# Altium footprint library Conectores GAM.PcbLib: 182 footprints (part 5 of 12)
Each footprint in its own frame and in the unit in brackets; x right, y up, seen from the top. Pads: shape width x height; smd on the part's side, far side on the other; paste and mask are expansions set on the pad; w line width, h text height; cw(c..) or ccw(c..) is an arc to the next point about the centre after c.
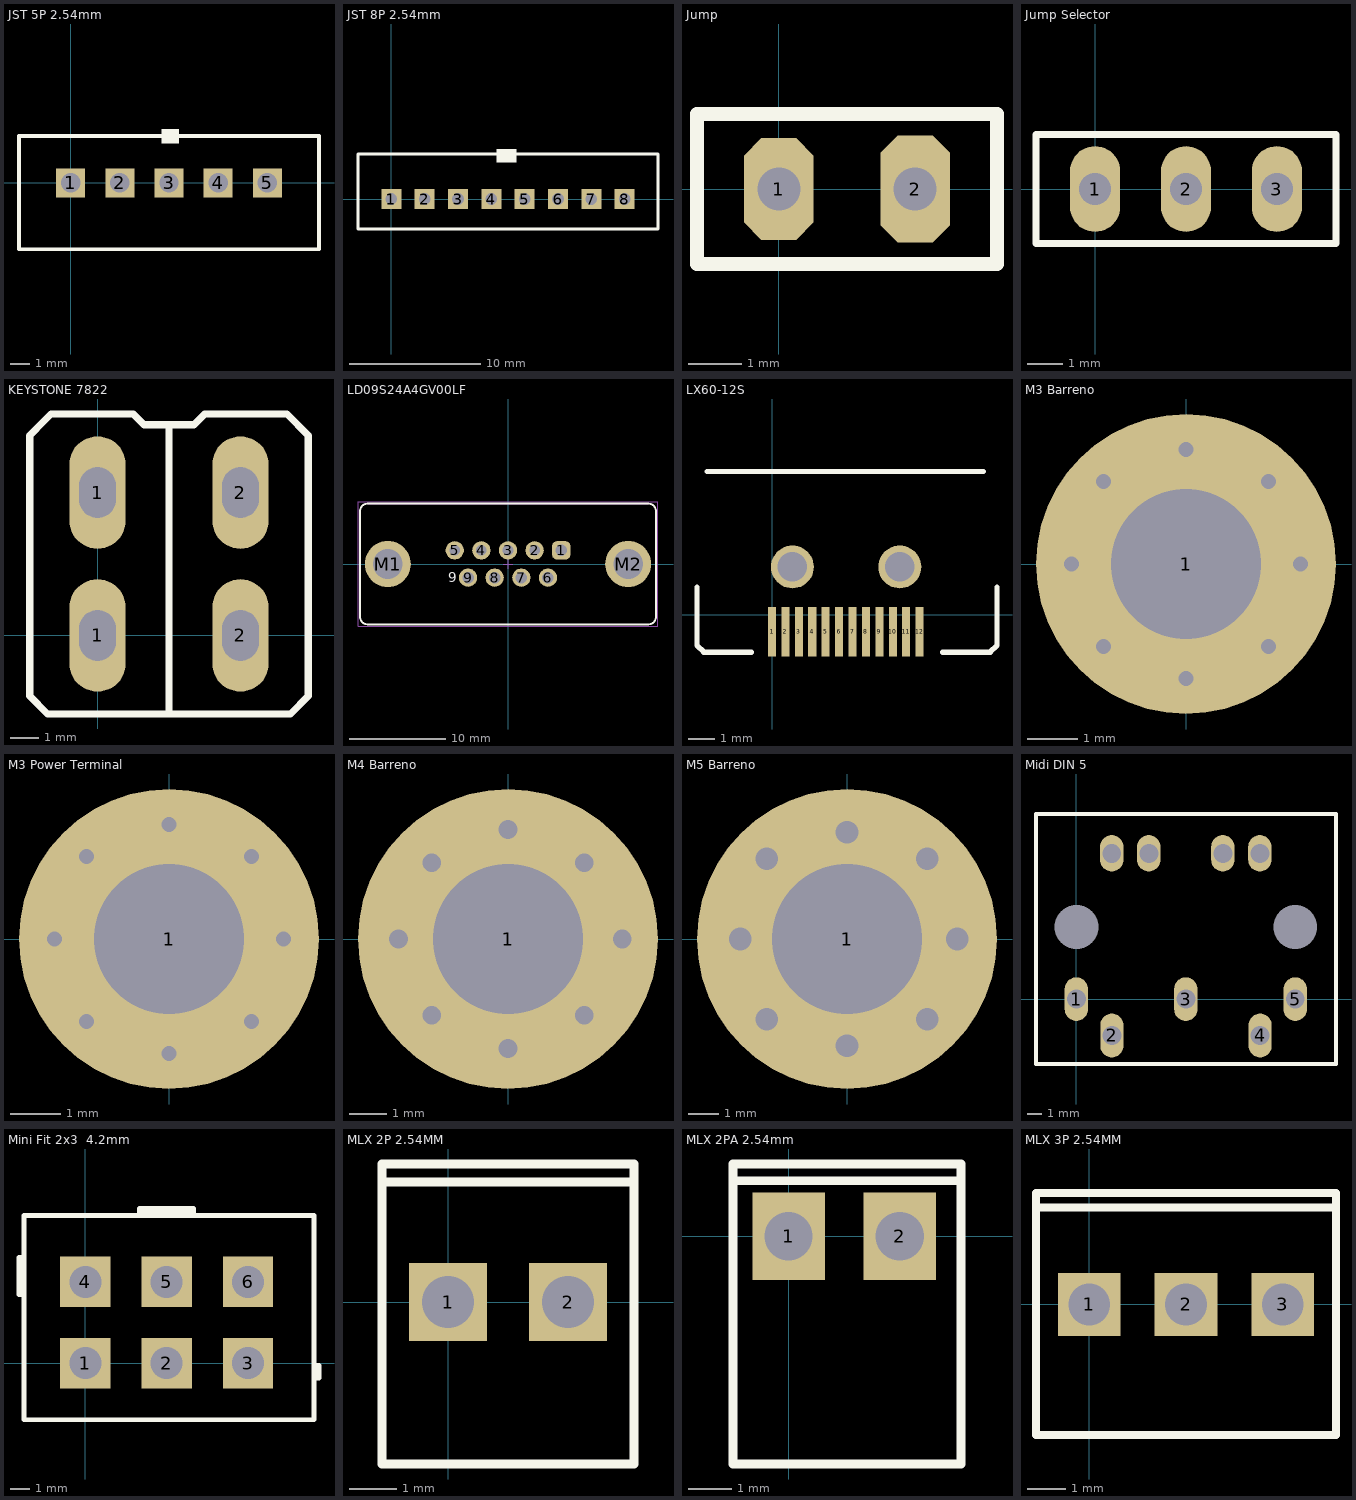
[diagram p4: the footprints below, top view; thin cyan lines are the x and y axes]

## JST 5P 2.54mm [mm]
pads (5):
  rect 1.5x1.5 hole 1: 1(0,0) 2(2.54,0) 3(5.08,0) 4(7.62,0) 5(10.16,0)
Top Overlay:
  rectangle: 4.699,2.032 5.588,2.794
  lines w0.2: -2.667,-3.429 -2.667,2.413 12.827,2.413 12.827,-3.429 -2.667,-3.429
3D body "JST 5X2.54mm.step": height 7.25, standoff -3.05, extent -2.42,-3.429 12.58,2.271

## JST 8P 2.54mm [mil]
pads (8):
  rect 60x60 hole 35.43: 1(0,0) 2(100,0) 3(200,0) 4(300,0) 5(400,0) 6(500,0) 7(600,0) 8(700,0)
Top Overlay:
  rectangle: 315,110 375,150
  lines w7.87: -100,-90 -100,135 800,135 800,-90 -100,-90
3D body "JST 8P 2.54mm.step": height 303.15, standoff -106.3, extent -91.89,-91.38 790,135

## Jump [mm] "Clip Jumper 2.54mm"
pads (2):
  oct 1.3x1.9 hole 0.8: 1(0,0)
  oct 1.3x2 hole 0.8: 2(2.54,0)
Top Overlay:
  lines w0.254: -1.524,-1.397 4.064,-1.397 4.064,1.397 -1.524,1.397 -1.524,-1.397
3D body "Header_Male_1Pin.STEP": height 8.54, standoff -3, extent 1.27,-1.245 3.81,1.245
3D body "Header_Male_1Pin.STEP": height 8.54, standoff -3, extent -1.27,-1.245 1.27,1.245
3D body "jumclip.stp": height 9, standoff 3, extent -1.23,-1.175 3.77,1.175

## Jump Selector [mm] "Clip Jumper 2.54mm Selector"
pads (3):
  oval 1.4x2.4 hole 0.9: 1(0,0) 2(2.54,0) 3(5.08,0)
Top Overlay:
  lines w0.2: -1.651,-1.524 6.731,-1.524 6.731,1.524 -1.651,1.524 -1.651,-1.524
3D body "Header_Male_1Pin.STEP": height 8.54, standoff -3, extent 1.27,-1.245 3.81,1.245
3D body "Header_Male_1Pin.STEP": height 8.54, standoff -3, extent -1.27,-1.245 1.27,1.245
3D body "jumclip.stp": height 9, standoff 3, extent -1.23,-1.175 3.77,1.175
3D body "Header_Male_1Pin.STEP": height 8.54, standoff -3, extent 3.81,-1.245 6.35,1.245

## KEYSTONE 7822 [mm] "Terminal 7822"
pads (4):
  oval 2x4 hole 1.3 slot 1.8 at 90 deg: 1(0,0) 1(0,5.08) 2(5.08,0) 2(5.08,5.08)
Top Overlay:
  lines w0.254: 2.54,-2.794 2.54,7.493 ; -2.413,-2.159 -2.413,7.112 -1.905,7.62 -1.651,7.874 0,7.874 0.889,7.874 1.27,7.874 1.651,7.493 3.429,7.493 3.81,7.874 4.445,7.874 5.08,7.874 6.731,7.874 7.493,7.112 7.493,-2.159 6.858,-2.794 -1.778,-2.794 -2.413,-2.159
3D body: height 12, standoff 8, extent -2.286,1.905 7.493,6.985
3D body: height 12, standoff 0.5, extent -2.159,6.763 7.493,8.731
3D body "Terminal-1266.step": height 11.36, standoff -1.34, extent -0.405,-0.762 0.405,19.298
3D body "Terminal-1266.step": height 11.36, standoff -1.34, extent 4.675,-0.762 5.485,19.298

## LD09S24A4GV00LF [mm] "Female 09p Straight With board clip & Hex screw UNC 4-40"
height 11
pads (11):
  rrect50% 1.9x1.9 hole 1.2: 1(5.54,1.42)
  round 1.9 hole 1.1: 2(2.77,1.42) 3(0,1.42) 4(-2.77,1.42) 5(-5.54,1.42)
  round 1.9 hole 1.2: 6(4.155,-1.42) 7(1.385,-1.42) 8(-1.385,-1.42) 9(-4.155,-1.42)
  round 4.8 hole 3.1: M1(-12.5,0) M2(12.5,0)
Top Overlay:
  lines w0.2: -15.405,-5.475 ccw(c-14.605,-5.475) -14.605,-6.275 14.605,-6.275 ccw(c14.605,-5.475) 15.405,-5.475 15.405,5.475 ccw(c14.605,5.475) 14.605,6.275 -14.605,6.275 ccw(c-14.605,5.475) -15.405,5.475 -15.405,-5.475
  text "9" at -6.2,-1.9 h1.02
Mechanical 11:
  lines w0.1: -15.405,-5.475 ccw(c-14.605,-5.475) -14.605,-6.275 14.605,-6.275 ccw(c14.605,-5.475) 15.405,-5.475 15.405,5.475 ccw(c14.605,5.475) 14.605,6.275 -14.605,6.275 ccw(c-14.605,5.475) -15.405,5.475 -15.405,-5.475
Mechanical 13:
  lines w0.1: -15.405,-5.475 ccw(c-14.605,-5.475) -14.605,-6.275 14.605,-6.275 ccw(c14.605,-5.475) 15.405,-5.475 15.405,5.475 ccw(c14.605,5.475) 14.605,6.275 -14.605,6.275 ccw(c-14.605,5.475) -15.405,5.475 -15.405,-5.475
Mechanical 15:
  lines w0.05: -0.5,0 0.5,0 ; 0,-0.5 0,0.5 ; -15.605,-6.475 -15.605,6.475 15.605,6.475 15.605,-6.475 -15.605,-6.475
3D body "61800929321.stp": height 13.15, standoff -3.65, extent -15.4,-6.275 15.4,6.275

## LX60-12S [mm] "Conectores I/O RCP 12 POS 0.5mm Sol RA SMD 12Termina"
pads (14):
  rect 0.3x1.85 smd: 1(0,-0.635) 2(0.5,-0.635) 3(1,-0.635) 4(1.5,-0.635) 5(2,-0.635) 6(2.5,-0.635) 7(3,-0.635) 8(3.5,-0.635) 9(4,-0.635) 10(4.5,-0.635) 11(5,-0.635) 12(5.5,-0.635)
  round 1.6 hole 1.1: ""(0.762,1.778) ""(4.762,1.778)
Top Overlay:
  lines w0.2: -2.794,1.016 -2.794,-1.143 -2.54,-1.397 -0.762,-1.397 ; -2.413,5.334 7.874,5.334 ; 6.35,-1.397 8.128,-1.397 8.382,-1.143 8.382,1.016
3D body "LX60-12S.stp": height 2.01, standoff -0.79, extent -2.54,-1.143 8.06,5.357

## M3 Barreno [mm] "Barreno con disipación M3"
pads (1):
  round 6 hole 3: 1(0,0)
via 1.651,1.651 diameter 0.5 hole 0.3
via 1.651,-1.651 diameter 0.5 hole 0.3
via -1.651,-1.651 diameter 0.5 hole 0.3
via -1.651,1.651 diameter 0.5 hole 0.3
via -2.286,0 diameter 0.5 hole 0.3
via 2.286,0 diameter 0.5 hole 0.3
via 0,2.286 diameter 0.5 hole 0.3
via 0,-2.286 diameter 0.5 hole 0.3

## M3 Power Terminal [mm] "Terminal M3 Para Cable Stand"
pads (1):
  round 6 hole 3: 1(0,0)
via 1.651,1.651 diameter 0.5 hole 0.3
via 1.651,-1.651 diameter 0.5 hole 0.3
via -1.651,-1.651 diameter 0.5 hole 0.3
via -1.651,1.651 diameter 0.5 hole 0.3
via -2.286,0 diameter 0.5 hole 0.3
via 2.286,0 diameter 0.5 hole 0.3
via 0,2.286 diameter 0.5 hole 0.3
via 0,-2.286 diameter 0.5 hole 0.3
3D body "136706.stp": height 14.04, standoff 10.36, extent -3.169,-11.5 3.175,3.175
3D body "M3x5.stp": height 15, standoff 7, extent -2.75,-2.75 2.75,2.75
3D body "TFF-M3x10_DR113.STEP": height 10.1, standoff 0.1, extent -2.871,-2.5 2.871,2.5

## M4 Barreno [mm] "Barreno con disipación M4"
pads (1):
  round 8 hole 4: 1(0,0)
via 0,-2.921 diameter 0.75 hole 0.5
via 0,2.921 diameter 0.75 hole 0.5
via 3.048,0 diameter 0.75 hole 0.5
via -2.921,0 diameter 0.75 hole 0.5
via -2.032,2.032 diameter 0.75 hole 0.5
via -2.032,-2.032 diameter 0.75 hole 0.5
via 2.032,-2.032 diameter 0.75 hole 0.5
via 2.032,2.032 diameter 0.75 hole 0.5

## M5 Barreno [mm] "Barreno con disipación M5"
pads (1):
  round 10 hole 5: 1(0,0)
via 2.667,2.667 diameter 1.25 hole 0.75
via 2.667,-2.667 diameter 1.25 hole 0.75
via -2.667,-2.667 diameter 1.25 hole 0.75
via -2.667,2.667 diameter 1.25 hole 0.75
via -3.556,0 diameter 1.25 hole 0.75
via 3.683,0 diameter 1.25 hole 0.75
via 0,3.556 diameter 1.25 hole 0.75
via 0,-3.556 diameter 1.25 hole 0.75

## Midi DIN 5 [mm] "Midi Connector DIN 5 Pin"
pads (11):
  oval 1.6x3 hole 1.3: 1(0,0) 2(2.437,-2.49) 3(7.505,0) 4(12.597,-2.49) 5(15.01,0)
  round 0 hole 3: ""(0,4.953) ""(15.01,4.953)
  oval 1.6x2.5 hole 1.3: ""(2.425,10) ""(4.965,10) ""(10.045,10) ""(12.585,10)
Top Overlay:
  lines w0.254: -2.77,-4.445 -2.77,12.7 17.804,12.7 17.804,-4.445 -2.77,-4.445
3D body "minidin5.STEP": height 21, standoff -3.55, extent -2.465,-3.048 17.499,12.446
3D body: height 4.5, standoff -3.5, extent 11.897,-3.188 13.292,-1.791
3D body: height 4.5, standoff -3.5, extent 1.737,-3.189 3.131,-1.791
3D body: height 4.5, standoff -3.5, extent 6.805,-0.699 8.2,0.699
3D body: height 1.5, standoff -3.5, extent 14.31,-0.699 15.704,0.699
3D body: height 1.5, standoff -3.5, extent -0.7,-0.699 0.694,0.699
3D body: height 1.5, standoff -3.5, extent 4.265,9.301 5.659,10.699
3D body: height 1.5, standoff -3.5, extent 9.345,9.301 10.739,10.699

## Mini Fit 2x3  4.2mm [mm] "Wire to Board Connector 2x3 4.2x4.2mm"
pads (6):
  rect 2.6x2.6 hole 1.65: 1(0,0) 2(4.2,0) 3(8.4,0) 4(0,4.2) 5(4.2,4.2) 6(8.4,4.2)
Top Overlay:
  lines w0.254: -3.175,3.556 -3.429,3.556 -3.429,5.461 -3.175,5.461 ; 2.794,7.62 2.794,8.001 5.588,8.001 5.588,7.62 ; 2.794,7.81 5.588,7.81 ; 11.811,-0.762 12.065,-0.762 12.065,-0.127 11.811,-0.127 ; -3.175,-2.921 11.811,-2.921 11.811,7.62 -3.175,7.62 -3.175,-2.921

## MLX 2P 2.54MM [mm]
pads (2):
  rect 1.65x1.65 hole 1.1: 1(0,0) 2(2.54,0)
Top Overlay:
  lines w0.2: -1.27,2.54 3.81,2.54 ; -1.397,-3.429 3.937,-3.429 3.937,2.921 -1.397,2.921 -1.397,-3.429
3D body "MLX2PR.step": height 11.76, standoff -3.04, extent -1.27,-3.279 3.81,2.521

## MLX 2PA 2.54mm [mm] "Molex Connector 2.54mm 2P Ang"
pads (2):
  rect 1.65x2 hole 1.1: 1(0,0) 2(2.54,0)
Top Overlay:
  lines w0.2: -1.27,1.27 3.81,1.27 ; -1.27,-5.207 3.937,-5.207 3.937,1.651 -1.27,1.651 -1.27,-5.207
3D body "MLX2P90.stp": height 5.9, standoff -2.3, extent -1.143,-13.266 3.937,0.254

## MLX 3P 2.54MM [mm]
pads (3):
  rect 1.65x1.65 hole 1.1: 1(0,0) 2(2.54,0) 3(5.08,0)
Top Overlay:
  lines w0.2: -1.27,2.54 6.35,2.54 ; -1.397,-3.429 6.477,-3.429 6.477,2.921 -1.397,2.921 -1.397,-3.429
3D body "MLX3PR.step": height 11.76, standoff -3.04, extent -1.27,-3.279 6.35,2.521